# Altium footprint library MPBoard.PcbLib: 123 footprints (part 6 of 8)
Each footprint in its own frame and in the unit in brackets; x right, y up, seen from the top. Pads: shape width x height; smd on the part's side, far side on the other; paste and mask are expansions set on the pad; w line width, h text height; cw(c..) or ccw(c..) is an arc to the next point about the centre after c.
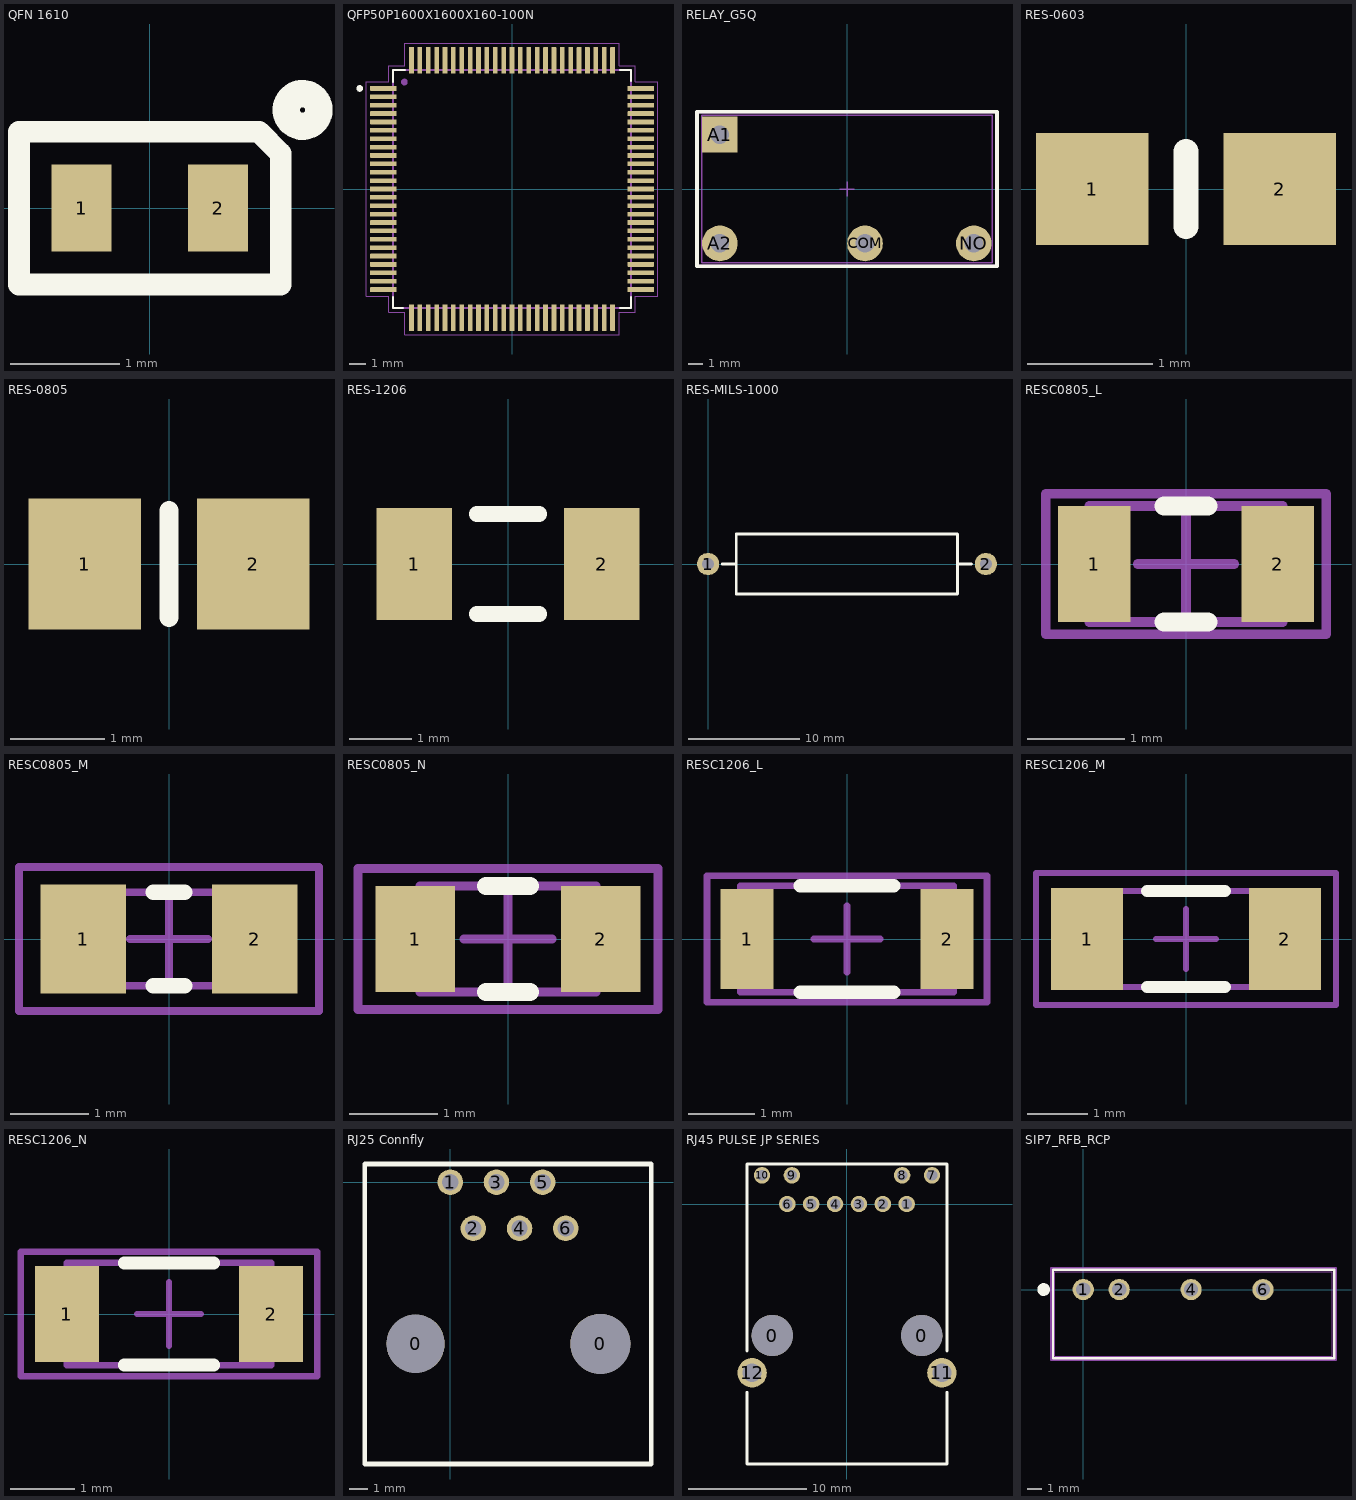
[diagram p5: the footprints below, top view; thin cyan lines are the x and y axes]

## QFN 1610 [mm] "YB"
height 1.3
pads (2):
  rect 0.55x0.8 smd: 1(-0.625,0) 2(0.625,0)
Top Overlay:
  circle w0.25: c1.4,0.9 r0.15
  lines w0.2: -1.2,-0.7 1.2,-0.7 1.2,0.5 1,0.7 -1.2,0.7 -1.2,-0.7
3D body "ST_1610.step": height 0.6, standoff 0, extent -0.85,-0.55 0.85,0.55

## QFP50P1600X1600X160-100N [mm]
pads (100):
  rrect7% 1.56x0.28 smd: 1(-7.68,6) 2(-7.68,5.5) 3(-7.68,5) 4(-7.68,4.5) 5(-7.68,4) 6(-7.68,3.5) 7(-7.68,3) 8(-7.68,2.5) 9(-7.68,2) 10(-7.68,1.5) 11(-7.68,1) 12(-7.68,0.5) 13(-7.68,0) 14(-7.68,-0.5) 15(-7.68,-1) 16(-7.68,-1.5) 17(-7.68,-2) 18(-7.68,-2.5) 19(-7.68,-3) 20(-7.68,-3.5) 21(-7.68,-4) 22(-7.68,-4.5) 23(-7.68,-5) 24(-7.68,-5.5) 25(-7.68,-6) 51(7.68,-6) 52(7.68,-5.5) 53(7.68,-5) 54(7.68,-4.5) 55(7.68,-4) 56(7.68,-3.5) 57(7.68,-3) 58(7.68,-2.5) 59(7.68,-2) 60(7.68,-1.5) 61(7.68,-1) 62(7.68,-0.5) 63(7.68,0) 64(7.68,0.5) 65(7.68,1) 66(7.68,1.5) 67(7.68,2) 68(7.68,2.5) 69(7.68,3) 70(7.68,3.5) 71(7.68,4) 72(7.68,4.5) 73(7.68,5) 74(7.68,5.5) 75(7.68,6)
  rrect7% 0.28x1.56 smd: 26(-6,-7.68) 27(-5.5,-7.68) 28(-5,-7.68) 29(-4.5,-7.68) 30(-4,-7.68) 31(-3.5,-7.68) 32(-3,-7.68) 33(-2.5,-7.68) 34(-2,-7.68) 35(-1.5,-7.68) 36(-1,-7.68) 37(-0.5,-7.68) 38(0,-7.68) 39(0.5,-7.68) 40(1,-7.68) 41(1.5,-7.68) 42(2,-7.68) 43(2.5,-7.68) 44(3,-7.68) 45(3.5,-7.68) 46(4,-7.68) 47(4.5,-7.68) 48(5,-7.68) 49(5.5,-7.68) 50(6,-7.68) 76(6,7.68) 77(5.5,7.68) 78(5,7.68) 79(4.5,7.68) 80(4,7.68) 81(3.5,7.68) 82(3,7.68) 83(2.5,7.68) 84(2,7.68) 85(1.5,7.68) 86(1,7.68) 87(0.5,7.68) 88(0,7.68) 89(-0.5,7.68) 90(-1,7.68) 91(-1.5,7.68) 92(-2,7.68) 93(-2.5,7.68) 94(-3,7.68) 95(-3.5,7.68) 96(-4,7.68) 97(-4.5,7.68) 98(-5,7.68) 99(-5.5,7.68) 100(-6,7.68)
Top Overlay:
  circle w0.2: c-9.09,6 r0.1
  lines w0.127: -7.1,-6.45 -7.1,-7.1 -6.5,-7.1 ; -7.1,6.4 -7.1,7.1 -6.4,7.1 ; 6.45,-7.1 7.1,-7.1 7.1,-6.45 ; 6.45,7.1 7.1,7.1 7.1,6.45
Mechanical 13:
  circle w0.2: c-6.423,6.381 r0.1
  lines w0.127: -7.1,-7.1 7.1,-7.1 7.1,7.1 -7.1,7.1 -7.1,-7.1
Mechanical 15:
  lines w0.05: -8.71,-6.39 -8.71,6.39 -7.35,6.39 -7.35,7.35 -6.39,7.35 -6.39,8.71 6.39,8.71 6.39,7.35 7.35,7.35 7.35,6.39 8.71,6.39 8.71,-6.39 7.35,-6.39 7.35,-7.35 6.39,-7.35 6.39,-8.71 -6.39,-8.71 -6.39,-7.35 -7.35,-7.35 -7.35,-6.39 -8.71,-6.39
3D body "STM32F411VET6.STEP": height 1.6, standoff 0, extent -8,-8 8,8

## RELAY_G5Q [mm]
height 10.6
pads (4):
  rect 2.5x2.5 hole 1.3: A1(-8.9,3.81)
  round 2.5 hole 1.3: A2(-8.9,-3.81) COM(1.26,-3.81) NO(8.88,-3.81)
Top Overlay:
  lines w0.254: -10.5,-5.4 10.5,-5.4 10.5,5.4 -10.5,5.4 -10.5,-5.4
Top Component Outline:
  lines w0.1: -10.15,-5.15 -10.15,5.15 10.15,5.15 10.15,-5.15 -10.15,-5.15
Top Courtyard:
  lines w0.1: -0.5,0 0.5,0 ; 0,-0.5 0,0.5 ; -10.425,-5.325 -10.425,5.325 10.425,5.325 10.425,-5.325 -10.425,-5.325
3D body "g5q-1a4-el2-ha.stp": height 16.2, standoff -3.4, extent -10.15,-5.15 10.15,5.15

## RES-0603 [mm]
pads (2):
  rect 0.9x0.9 smd: 1(-0.75,0) 2(0.75,0)
Top Overlay:
  lines w0.2: 0,-0.3 0,0.3
3D body "RES-0603.STEP": height 0.5, standoff 0, extent -0.8,-0.4 0.8,0.4

## RES-0805 [mm]
pads (2):
  rect 1.2x1.4 smd: 1(-0.9,0) 2(0.9,0)
Top Overlay:
  lines w0.2: 0,-0.57 0,0.57
3D body "RES-0805.STEP": height 0.45, standoff 0, extent -1.025,-0.625 0.975,0.625

## RES-1206 [mm]
pads (2):
  rect 1.2x1.8 smd: 1(-1.5,0) 2(1.5,0)
Top Overlay:
  lines w0.25: -0.5,-0.8 0.5,-0.8 ; -0.5,0.8 0.5,0.8
3D body "RES-1206.STEP": height 0.55, standoff 0, extent -1.55,-0.775 1.55,0.775

## RES-MILS-1000 [mm]
pads (2):
  round 2 hole 1.1: 1(0,0) 2(25,0)
Top Overlay:
  lines w0.25: 1.27,0 2.54,0 ; 22.44,0 23.71,0 ; 2.54,-2.7 22.44,-2.7 22.44,2.7 2.54,2.7 2.54,-2.7
3D body "res-mils-1000.stp": height 5.91, standoff -3.4, extent -0.425,-2.92 25.425,2.9

## RESC0805_L [mm] "Chip Resistor, 2-Leads, Body 2,00x1,25mm, IPC High Density"
height 0.7
pads (2):
  rect 0.75x1.2 smd: 1(-0.95,0) 2(0.95,0)
Top Overlay:
  lines w0.2: -0.225,-0.6 0.225,-0.6 ; -0.225,0.6 0.225,0.6
Top Component Outline:
  lines w0.1: -1,-0.6 -1,0.6 1,0.6 1,-0.6 -1,-0.6
Top Courtyard:
  lines w0.1: -0.5,0 0.5,0 ; 0,-0.5 0,0.5 ; -1.45,-0.725 1.45,-0.725 1.45,0.725 -1.45,0.725 -1.45,-0.725
3D body "chip_0805_r.STEP": height 0.44, standoff -0.02, extent -1,-0.6 1,0.6

## RESC0805_M [mm] "Chip Resistor, 2-Leads, Body 2,00x1,25mm, IPC Low Density"
height 0.7
pads (2):
  rect 1.1x1.4 smd: 1(-1.1,0) 2(1.1,0)
Top Overlay:
  lines w0.2: -0.2,-0.6 0.2,-0.6 ; -0.2,0.6 0.2,0.6
Top Component Outline:
  lines w0.1: -1,-0.6 -1,0.6 1,0.6 1,-0.6 -1,-0.6
Top Courtyard:
  lines w0.1: -0.5,0 0.5,0 ; 0,-0.5 0,0.5 ; -1.925,-0.925 -1.925,0.925 1.925,0.925 1.925,-0.925 -1.925,-0.925
3D body "chip_0805_r.STEP": height 0.44, standoff -0.02, extent -1,-0.6 1,0.6

## RESC0805_N [mm] "Chip Resistor, 2-Leads, Body 2,00x1,25mm, IPC Medium Density"
height 0.7
pads (2):
  rect 0.9x1.2 smd: 1(-1.05,0) 2(1.05,0)
Top Overlay:
  lines w0.2: -0.25,-0.6 0.25,-0.6 ; -0.25,0.6 0.25,0.6
Top Component Outline:
  lines w0.1: -1,-0.6 1,-0.6 1,0.6 -1,0.6 -1,-0.6
Top Courtyard:
  lines w0.1: -0.5,0 0.5,0 ; 0,-0.5 0,0.5 ; -1.7,-0.8 1.7,-0.8 1.7,0.8 -1.7,0.8 -1.7,-0.8
3D body "chip_0805_r.STEP": height 0.44, standoff -0.02, extent -1,-0.6 1,0.6

## RESC1206_L [mm] "Chip Resistor, 2-Leads, Body 3,13x1,55mm, IPC High Density"
height 0.7
pads (2):
  rect 0.8x1.5 smd: 1(-1.5,0) 2(1.5,0)
Top Overlay:
  lines w0.2: -0.7,-0.8 0.7,-0.8 ; -0.7,0.8 0.7,0.8
Top Component Outline:
  lines w0.1: -1.6,-0.8 1.6,-0.8 1.6,0.8 -1.6,0.8 -1.6,-0.8
Top Courtyard:
  lines w0.1: -0.5,0 0.5,0 ; 0,-0.5 0,0.5 ; -2.1,-0.95 2.1,-0.95 2.1,0.95 -2.1,0.95 -2.1,-0.95
3D body "chip_1206_r.STEP": height 0.5, standoff 0, extent -1.6,-0.8 1.6,0.8

## RESC1206_M [mm] "Chip Resistor, 2-Leads, Body 3,13x1,55mm, IPC Low Density"
height 0.7
pads (2):
  rect 1.2x1.7 smd: 1(-1.65,0) 2(1.65,0)
Top Overlay:
  lines w0.2: -0.65,-0.8 0.65,-0.8 ; -0.65,0.8 0.65,0.8
Top Component Outline:
  lines w0.1: -1.6,-0.8 1.6,-0.8 1.6,0.8 -1.6,0.8 -1.6,-0.8
Top Courtyard:
  lines w0.1: -0.5,0 0.5,0 ; 0,-0.5 0,0.5 ; -2.5,-1.1 2.5,-1.1 2.5,1.1 -2.5,1.1 -2.5,-1.1
3D body "chip_1206_r.STEP": height 0.5, standoff 0, extent -1.6,-0.8 1.6,0.8

## RESC1206_N [mm] "Chip Resistor, 2-Leads, Body 3,13x1,55mm, IPC Medium Density"
height 0.7
pads (2):
  rect 1x1.5 smd: 1(-1.6,0) 2(1.6,0)
Top Overlay:
  lines w0.2: -0.7,-0.8 0.7,-0.8 ; -0.7,0.8 0.7,0.8
Top Component Outline:
  lines w0.1: -1.6,-0.8 1.6,-0.8 1.6,0.8 -1.6,0.8 -1.6,-0.8
Top Courtyard:
  lines w0.1: -0.5,0 0.5,0 ; 0,-0.5 0,0.5 ; -2.325,-0.975 2.325,-0.975 2.325,0.975 -2.325,0.975 -2.325,-0.975
3D body "chip_1206_r.STEP": height 0.5, standoff 0, extent -1.6,-0.8 1.6,0.8

## RJ25 Connfly [mm]
height 15
pads (8):
  round 3.2 hole 3.2 unplated: 0(-1.905,-8.89)
  round 3.3 hole 3.3 unplated: 0(8.255,-8.89)
  round 1.4 hole 0.9: 1(0,0) 2(1.27,-2.54) 3(2.54,0) 4(3.81,-2.54) 5(5.08,0) 6(6.35,-2.54)
Top Overlay:
  lines w0.25: -4.7,-15.5 11.05,-15.5 11.05,1 -4.7,1 -4.7,-15.5
3D body "RJ25.stp": height 16.25, standoff -4.07, extent -4.821,-15.375 11.181,1.135

## RJ45 PULSE JP SERIES [mm]
height 15
pads (14):
  round 3.5 hole 3.5 unplated: 0(-6.35,-11.18) 0(6.35,-11.18)
  round 1.4 hole 0.9: 1(5.075,0) 2(3.045,0) 3(1.015,0) 4(-1.015,0) 5(-3.045,0) 6(-5.075,0) 7(7.225,2.44) 8(4.685,2.44) 9(-4.685,2.44) 10(-7.225,2.44)
  round 2.5 hole 1.6: 11(8.065,-14.35) 12(-8.065,-14.35)
Top Overlay:
  lines w0.25: -8.5,-16 -8.5,-22.1 8.5,-22.1 8.5,-16 ; -8.5,-12.5 -8.5,3.4 8.5,3.4 8.5,-12.5
3D body "rj45_pulse_jp011821unl.stp": height 14.7, standoff -3.12, extent -9.413,-22.1 9.413,3.4

## SIP7_RFB_RCP [mm]
pads (4):
  round 1.5 / inner round 1.5 / far side rect 1.5x1.5 hole 1 paste-0.826 mask+0: 1(0,0)
  round 1.5 hole 1 paste-0.826 mask+0: 2(2.54,0) 4(7.62,0) 6(12.7,0)
Top Overlay:
  circle w0.5: c-2.8,0 r0.2
  lines w0.152: -2.131,-4.854 -2.131,1.394 17.731,1.394 17.731,-4.854 -2.131,-4.854
Mechanical 13:
  lines w0.025: -2.004,-4.727 -2.004,1.267 17.604,1.267 17.604,-4.727 -2.004,-4.727
Mechanical 15:
  lines w0.152: -2.258,-4.981 17.858,-4.981 17.858,1.521 -2.258,1.521 -2.258,-4.981
3D body "StepFile-79.stp": height 10.2, standoff -4.1, extent -2.032,-4.778 17.568,1.222